# Altium footprint library PCBKU.PcbLib: 192 footprints (part 1 of 12)
Each footprint in its own frame and in the unit in brackets; x right, y up, seen from the top. Pads: shape width x height; smd on the part's side, far side on the other; paste and mask are expansions set on the pad; w line width, h text height; cw(c..) or ccw(c..) is an arc to the next point about the centre after c.
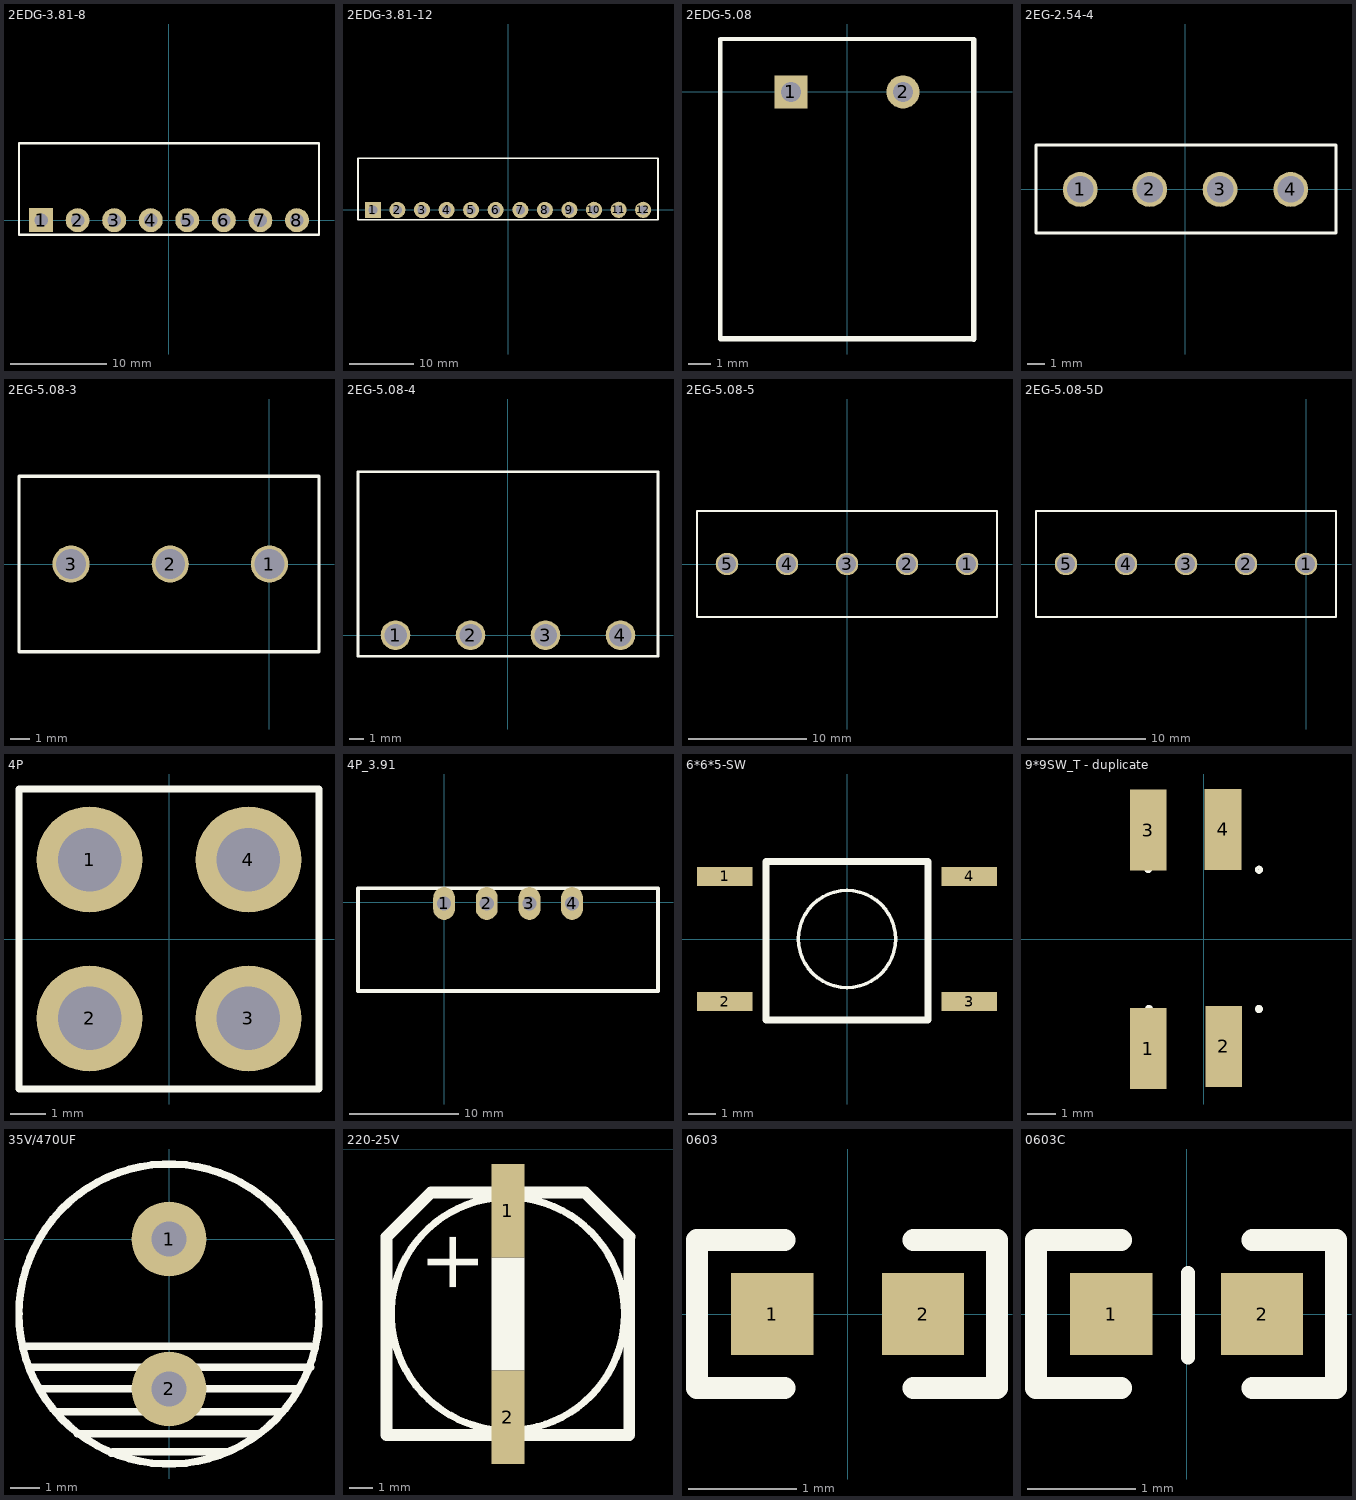
[diagram p0: the footprints below, top view; thin cyan lines are the x and y axes]

## 2EDG-3.81-8 [mm]
pads (8):
  rect 2.5x2.5 hole 1.4: 1(-13.335,0)
  round 2.5 hole 1.4: 2(-9.525,0) 3(-5.715,0) 4(-1.905,0) 5(1.905,0) 6(5.715,0) 7(9.525,0) 8(13.335,0)
Top Overlay:
  lines w0.254: -15.64,-1.5 -15.64,8 15.64,8 15.64,-1.5 -15.64,-1.5

## 2EDG-3.81-12 [mm]
pads (12):
  rect 2.5x2.5 hole 1.4: 1(-20.955,-0.013)
  round 2.5 hole 1.4: 2(-17.145,-0.013) 3(-13.335,-0.013) 4(-9.525,-0.013) 5(-5.715,-0.013) 6(-1.905,-0.013) 7(1.905,-0.013) 8(5.715,-0.013) 9(9.525,0.013) 10(13.335,0.013) 11(17.145,0.013) 12(20.955,0.013)
Top Overlay:
  lines w0.254: -23.26,-1.513 -23.26,7.987 23.26,7.987 23.26,-1.513 -23.26,-1.513

## 2EDG-5.08 [mm]
pads (2):
  rect 1.5x1.5 hole 0.9: 1(-2.54,0)
  round 1.5 hole 0.9: 2(2.54,0)
Top Overlay:
  lines w0.2: -5.75,-11.2 -5.75,2.4 5.75,2.4
  lines w0.254: -5.725,-11.2 5.75,-11.2 ; 5.75,-11.206 5.75,2.375

## 2EG-2.54-4 [mm]
pads (4):
  round 2 hole 1.524: 1(-6.051,0) 2(-2.051,0) 3(1.987,0) 4(6.051,0)
Top Overlay:
  lines w0.178: -8.591,-2.515 -8.591,2.565 8.655,2.565 8.655,-2.515 -8.591,-2.515

## 2EG-5.08-3 [mil]
pads (3):
  round 75 hole 60: 1(0,0) 2(-200,0) 3(-400,0)
Top Overlay:
  lines w7: -505,-177.17 100,-177.17 100,177.17 -505,177.17 -505,-177.17

## 2EG-5.08-4 [mm]
pads (4):
  round 2 hole 1.524: 1(-7.62,0) 2(-2.54,0) 3(2.54,0) 4(7.62,0)
Top Overlay:
  lines w0.178: -10.16,-1.425 10.16,-1.425 10.16,11.075 -10.16,11.075 -10.16,-1.425

## 2EG-5.08-5 [mil]
pads (5):
  round 75 hole 60: 1(400,0) 2(200,0) 3(0,0) 4(-200,0) 5(-400,0)
Top Overlay:
  lines w7: -500,-177.17 -500,177.17 500,177.17 500,-177.17 -500,-177.17

## 2EG-5.08-5D [mil]
pads (5):
  round 75 hole 60: 1(0,0) 2(-200,0) 3(-400,0) 4(-600,0) 5(-800,0)
Top Overlay:
  lines w7: -900,-177.17 -900,177.17 100,177.17 100,-177.17 -900,-177.17
3D body: height 866.14, standoff -192.91, extent -900,-88.43 100,510

## 4P [mm]
pads (4):
  round 3 hole 1.8: 1(-2.25,2.25) 2(-2.25,-2.25) 3(2.25,-2.25) 4(2.25,2.25)
Top Overlay:
  lines w0.203: -4.25,-4.25 -4.25,4.25 ; -4.23,-4.25 4.25,-4.25 4.25,4.25 -4.23,4.25

## 4P_3.91 [mm]
pads (4):
  oval 2x3 hole 1.3: 1(0,-0.127) 2(3.9,-0.127) 3(7.8,-0.127) 4(11.7,-0.127)
Top Overlay:
  lines w0.35: -7.874,-8.128 8.128,-8.128 19.558,-8.128 19.558,1.27 -7.874,1.27 -7.874,-8.128

## 6*6*5-SW [mm]
pads (4):
  rect 2x0.7 smd: 1(-4.4,2.25) 2(-4.4,-2.25) 3(4.4,-2.25) 4(4.4,2.25)
Top Overlay:
  circle w0.127: c0,0 r1.75
  lines w0.254: -2.921,-2.921 2.921,-2.921 2.921,2.794 -2.921,2.794 -2.921,-2.921

## 9*9SW_T - duplicate [mil]
height 43.31
pads (4):
  rect 50x110.24 smd: 1(-76,-149) 2(27,-146) 3(-76,149) 4(26,150)
Top Overlay:
  circle w5: c-76,96 r3
  circle w5: c75,95 r3
  circle w5: c-75,-95 r3
  circle w5: c75,-95 r3

## 35V/470UF [mm]
height 1.1
pads (2):
  round 2.54 hole 1.2: 1(0,0) 2(0,-5.08)
Top Overlay:
  circle w0.254: c0,-2.54 r5.08
  lines w0.254: -4.953,-3.632 4.801,-3.632 ; -4.75,-4.343 4.801,-4.343 ; -4.394,-5.08 0,-5.08 4.394,-5.08 ; -3.85,-5.85 3.85,-5.85 ; -3.1,-6.6 3.05,-6.6 ; -1.95,-7.25 -1.9,-7.2 1.95,-7.2

## 220-25V [mm]
pads (2):
  rect 1.4x4 smd: 1(21.971,-2.682) 2(21.971,-11.542)
Top Overlay:
  circle w0.305: c21.971,-7.105 r5
  region: 21.27,-4.688 21.27,-9.531 22.678,-9.531 22.678,-4.688
  lines w0.508: 27.171,-3.805 27.171,-12.302 16.77,-12.302 16.77,-3.802 18.667,-1.905 25.277,-1.905 27.174,-3.802
  text "+" at 18.531,-3.463 h2.5

## 0603 [mil]
height 43.31
pads (2):
  rect 30x30 smd: 1(-27.5,0) 2(27.5,0)
Top Overlay:
  lines w8: -23,-27 -55,-27 -55,27 -23,27 ; 24,-27 54.5,-27 54.5,27 24,27
3D body: height 11.89, standoff 0, extent -32,-15.5 31,16

## 0603C [mil]
height 43.31
pads (2):
  rect 30x30 smd: 1(-27.5,0) 2(27.5,0)
Top Overlay:
  lines w5: 0.5,-16 0.5,15
  lines w8: -24,-27 -55,-27 -55,27 -24,27 ; 24,-27 54.5,-27 54.5,27 24,27
3D body: height 11.89, standoff 0, extent -32,-16 31,15.5